# Altium footprint library CM3Board.PcbLib: 127 footprints (part 6 of 8)
Each footprint in its own frame and in the unit in brackets; x right, y up, seen from the top. Pads: shape width x height; smd on the part's side, far side on the other; paste and mask are expansions set on the pad; w line width, h text height; cw(c..) or ccw(c..) is an arc to the next point about the centre after c.
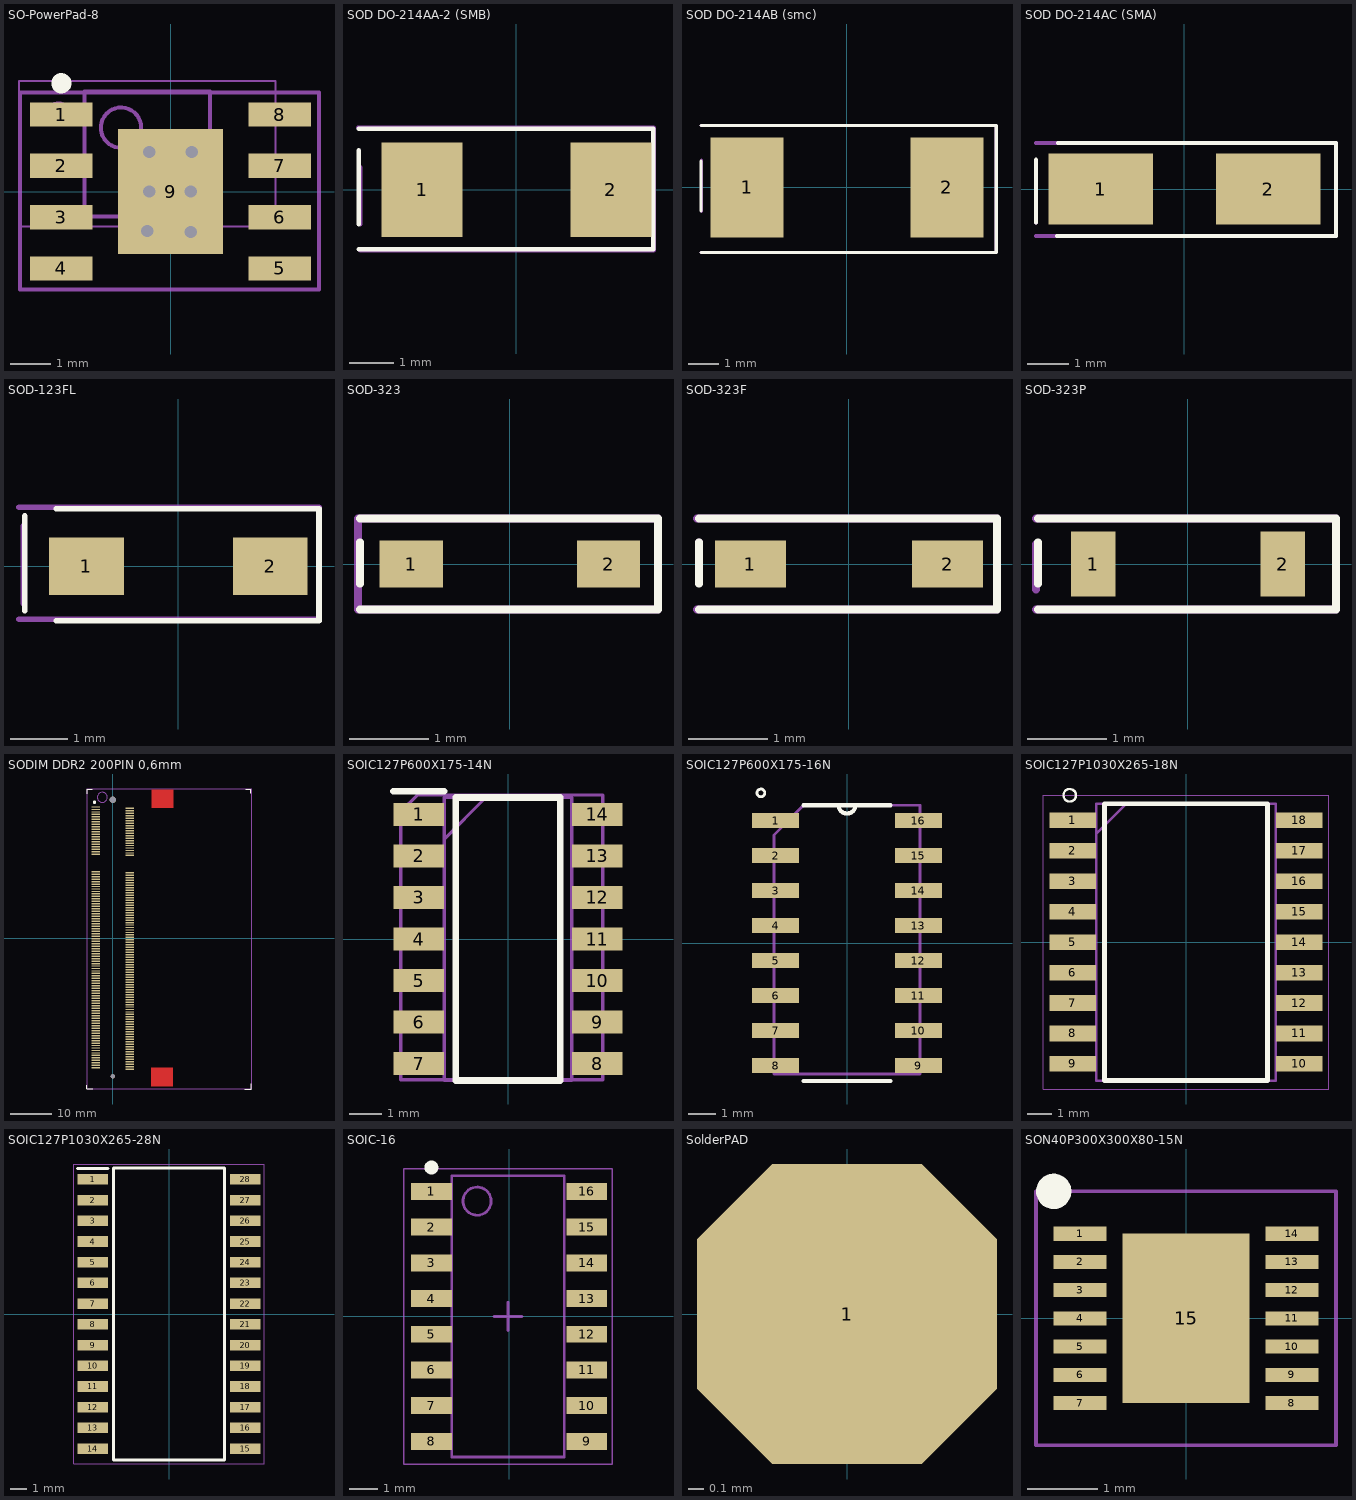
[diagram p5: the footprints below, top view; thin cyan lines are the x and y axes]

## SO-PowerPad-8 [mm]
pads (9):
  rect 1.55x0.6 smd: 1(-2.7,1.905) 2(-2.7,0.635) 3(-2.7,-0.635) 4(-2.7,-1.905) 5(2.7,-1.905) 6(2.7,-0.635) 7(2.7,0.635) 8(2.7,1.905)
  rect 2.6x3.1 smd: 9(0,0)
via -0.525,0 diameter 0.5 hole 0.3
via 0.5,0 diameter 0.5 hole 0.3
via -0.575,-0.975 diameter 0.5 hole 0.3
via 0.525,0.975 diameter 0.5 hole 0.3
via -0.525,0.975 diameter 0.5 hole 0.3
via 0.5,-1 diameter 0.5 hole 0.3
Top Overlay:
  circle w0.25: c-2.7,2.68 r0.125
Mechanical 13:
  circle w0.1: c-1.225,1.58 r0.5
  lines w0.1: -2.125,-0.62 -2.125,2.48 0.975,2.48 0.975,-0.62 -2.125,-0.62
Mechanical 15:
  lines w0.05: -3.75,-0.87 -3.75,2.73 2.6,2.73 2.6,-0.87 -3.75,-0.87
  lines w0.1: -1.075,0.93 -0.075,0.93 ; -0.575,0.43 -0.575,1.43
Mechanical 29:
  circle w0.254: c-2.775,1.925 r0.177
  lines w0.1: -3.725,-2.425 -3.725,2.454 3.675,2.454 3.675,-2.425 -3.725,-2.425
  text ".Designator" at -2.85,-1.225 h1
3D body "TPS54360DDA.step": height 1.78, standoff 0.19, extent -3.075,-2.475 3.125,2.525

## SOD DO-214AA-2 (SMB) [mm]
pads (2):
  rect 1.8x2.1 smd: 1(-2.1,0) 2(2.1,0)
Top Overlay:
  lines w0.1: -3.505,-1.325 3.045,-1.325 3.045,1.35 -3.505,1.35 ; -3.505,-0.775 -3.505,0.875
Mechanical 29:
  lines w0.1: -3.525,1.375 3.05,1.375 3.05,-1.35 -3.475,-1.35 ; -3.475,-0.775 -3.475,0.5
  text ".Designator" at -0.525,-0.25 h1
3D body "DO-214AA SMB.step": height 2.35, standoff 0.05, extent -2.7,-1.8 2.7,1.8

## SOD DO-214AB (smc) [mm]
pads (2):
  rect 2.4x3.3 smd: 1(-3.3,0) 2(3.3,0)
Top Overlay:
  lines w0.1: -4.825,-2.15 4.925,-2.15 4.925,2.05 -4.825,2.05 ; -4.825,-0.775 -4.825,0.875
Mechanical 29:
  lines w0.1: -4.825,-2.15 4.925,-2.15 4.925,2.05 -4.825,2.05 ; -4.8,-0.8 -4.8,0.9
  text ".Designator" at -4.05,-1.275 h1
3D body "DO-214AB.step": height 2.4, standoff 0.03, extent -4.09,-3.05 4.04,3.05

## SOD DO-214AC (SMA) [mm]
pads (2):
  rect 2.5x1.7 smd: 1(-2,0) 2(2,0)
Top Overlay:
  lines w0.1: -3.55,-0.8 -3.55,0.7 ; -3.05,-1.125 3.625,-1.125 3.625,1.1 -3.025,1.1
Mechanical 29:
  lines w0.1: -3.55,-1.125 3.625,-1.125 3.625,1.1 -3.55,1.1 ; -3.55,-0.8 -3.55,0.625
  text ".Designator" at -2.825,-0.875 h1
3D body "DO-214AC.step": height 2.6, standoff 0.03, extent -2.55,-1.425 2.95,1.375

## SOD-123FL [mm]
pads (2):
  rect 1.3x1 smd: 1(-1.6,0) 2(1.6,0)
Top Overlay:
  lines w0.1: -2.675,-0.775 -2.675,0.875 ; -2.125,-0.95 2.45,-0.95 2.45,1 -2.125,1
Mechanical 29:
  lines w0.1: -2.775,-0.925 2.45,-0.925 2.45,1.025 -2.775,1.025 ; -2.7,-0.65 -2.7,0.7
  text ".Designator" at -1.8,-0.35 h1
3D body "SOD-123FL.STEP": height 0.95, standoff 0, extent -1.825,-0.825 1.775,0.825

## SOD-323 [mm]
pads (2):
  rect 0.8x0.6 smd: 1(-1.25,0) 2(1.25,0)
Top Overlay:
  lines w0.1: -1.9,-0.575 1.875,-0.575 1.875,0.575 -1.9,0.575 ; -1.9,-0.25 -1.9,0.275
Mechanical 29:
  lines w0.1: 1.875,0.575 1.875,-0.575 0.75,-0.575 -1.925,-0.575 -1.925,0.575 1.875,0.575 ; 1.875,0.575 1.875,0.575
  text ".Designator" at -1.6,-0.4 h1
3D body "SOD323.step": height 0.9, standoff -0.09, extent -1.225,-0.625 1.275,0.625

## SOD-323F [mm]
pads (2):
  rect 0.9x0.6 smd: 1(-1.25,0) 2(1.25,0)
Top Overlay:
  lines w0.1: -1.9,-0.575 1.875,-0.575 1.875,0.575 -1.9,0.575 ; -1.9,-0.25 -1.9,0.275
Mechanical 29:
  lines w0.1: -1.925,-0.575 0.75,-0.575 1.875,-0.575 1.875,0.575 ; -1.925,0.575 1.875,0.575 ; -1.9,-0.225 -1.9,0.275 ; 1.875,0.575 1.875,0.575
  text ".Designator" at -1.6,-0.4 h1
3D body "SOD323.step": height 0.9, standoff -0.09, extent -1.225,-0.625 1.275,0.625

## SOD-323P [mm]
pads (2):
  rect 0.56x0.82 smd: 1(-1.2,0) 2(1.2,0)
Top Overlay:
  lines w0.1: -1.9,-0.575 1.875,-0.575 1.875,0.575 -1.9,0.575 ; -1.9,-0.25 -1.9,0.275
Mechanical 29:
  lines w0.1: -1.925,-0.575 0.75,-0.575 1.875,-0.575 1.875,0.575 ; -1.925,-0.325 -1.925,0.25 ; -1.925,0.575 1.875,0.575 ; 1.875,0.575 1.875,0.575
  text ".Designator" at -1.6,-0.4 h1
3D body "SOD323.step": height 0.9, standoff -0.09, extent -1.225,-0.625 1.275,0.625

## SODIM DDR2 200PIN 0,6mm [mm]
height 3.56
pads (202):
  rect 2x0.35 smd: 1(-4.1,31.65) 2(4.1,31.35) 3(-4.1,31.05) 4(4.1,30.75) 5(-4.1,30.45) 6(4.1,30.15) 7(-4.1,29.85) 8(4.1,29.55) 9(-4.1,29.25) 10(4.1,28.95) 11(-4.1,28.65) 12(4.1,28.35) 13(-4.1,28.05) 14(4.1,27.75) 15(-4.1,27.45) 16(4.1,27.15) 17(-4.1,26.85) 18(4.1,26.55) 19(-4.1,26.25) 20(4.1,25.95) 21(-4.1,25.65) 22(4.1,25.35) 23(-4.1,25.05) 24(4.1,24.75) 25(-4.1,24.45) 26(4.1,24.15) 27(-4.1,23.85) 28(4.1,23.55) 29(-4.1,23.25) 30(4.1,22.95) 31(-4.1,22.65) 32(4.1,22.35) 33(-4.1,22.05) 34(4.1,21.75) 35(-4.1,21.45) 36(4.1,21.15) 37(-4.1,20.85) 38(4.1,20.55) 39(-4.1,20.25) 40(4.1,19.95) 41(-4.1,16.05) 42(4.1,15.75) 43(-4.1,15.45) 44(4.1,15.15) 45(-4.1,14.85) 46(4.1,14.55) 47(-4.1,14.25) 48(4.1,13.95) 49(-4.1,13.65) 50(4.1,13.35) 51(-4.1,13.05) 52(4.1,12.75) 53(-4.1,12.45) 54(4.1,12.15) 55(-4.1,11.85) 56(4.1,11.55) 57(-4.1,11.25) 58(4.1,10.95) 59(-4.1,10.65) 60(4.1,10.35) 61(-4.1,10.05) 62(4.1,9.75) 63(-4.1,9.45) 64(4.1,9.15) 65(-4.1,8.85) 66(4.1,8.55) 67(-4.1,8.25) 68(4.1,7.95) 69(-4.1,7.65) 70(4.1,7.35) 71(-4.1,7.05) 72(4.1,6.75) 73(-4.1,6.45) 74(4.1,6.15) 75(-4.1,5.85) 76(4.1,5.55) 77(-4.1,5.25) 78(4.1,4.95) 79(-4.1,4.65) 80(4.1,4.35) 81(-4.1,4.05) 82(4.1,3.75) 83(-4.1,3.45) 84(4.1,3.15) 85(-4.1,2.85) 86(4.1,2.55) 87(-4.1,2.25) 88(4.1,1.95) 89(-4.1,1.65) 90(4.1,1.35) 91(-4.1,1.05) 92(4.1,0.75) 93(-4.1,0.45) 94(4.1,0.15) 95(-4.1,-0.15) 96(4.1,-0.45) 97(-4.1,-0.75) 98(4.1,-1.05) 99(-4.1,-1.35) 100(4.1,-1.65) 101(-4.1,-1.95) 102(4.1,-2.25) 103(-4.1,-2.55) 104(4.1,-2.85) 105(-4.1,-3.15) 106(4.1,-3.45) 107(-4.1,-3.75) 108(4.1,-4.05) 109(-4.1,-4.35) 110(4.1,-4.65) 111(-4.1,-4.95) 112(4.1,-5.25) 113(-4.1,-5.55) 114(4.1,-5.85) 115(-4.1,-6.15) 116(4.1,-6.45) 117(-4.1,-6.75) 118(4.1,-7.05) 119(-4.1,-7.35) 120(4.1,-7.65) 121(-4.1,-7.95) 122(4.1,-8.25) 123(-4.1,-8.55) 124(4.1,-8.85) 125(-4.1,-9.15) 126(4.1,-9.45) 127(-4.1,-9.75) 128(4.1,-10.05) 129(-4.1,-10.35) 130(4.1,-10.65) 131(-4.1,-10.95) 132(4.1,-11.25) 133(-4.1,-11.55) 134(4.1,-11.85) 135(-4.1,-12.15) 136(4.1,-12.45) 137(-4.1,-12.75) 138(4.1,-13.05) 139(-4.1,-13.35) 140(4.1,-13.65) 141(-4.1,-13.95) 142(4.1,-14.25) 143(-4.1,-14.55) 144(4.1,-14.85) 145(-4.1,-15.15) 146(4.1,-15.45) 147(-4.1,-15.75) 148(4.1,-16.05) 149(-4.1,-16.35) 150(4.1,-16.65) 151(-4.1,-16.95) 152(4.1,-17.25) 153(-4.1,-17.55) 154(4.1,-17.85) 155(-4.1,-18.15) 156(4.1,-18.45) 157(-4.1,-18.75) 158(4.1,-19.05) 159(-4.1,-19.35) 160(4.1,-19.65) 161(-4.1,-19.95) 162(4.1,-20.25) 163(-4.1,-20.55) 164(4.1,-20.85) 165(-4.1,-21.15) 166(4.1,-21.45) 167(-4.1,-21.75) 168(4.1,-22.05) 169(-4.1,-22.35) 170(4.1,-22.65) 171(-4.1,-22.95) 172(4.1,-23.25) 173(-4.1,-23.55) 174(4.1,-23.85) 175(-4.1,-24.15) 176(4.1,-24.45) 177(-4.1,-24.75) 178(4.1,-25.05) 179(-4.1,-25.35) 180(4.1,-25.65) 181(-4.1,-25.95) 182(4.1,-26.25) 183(-4.1,-26.55) 184(4.1,-26.85) 185(-4.1,-27.15) 186(4.1,-27.45) 187(-4.1,-27.75) 188(4.1,-28.05) 189(-4.1,-28.35) 190(4.1,-28.65) 191(-4.1,-28.95) 192(4.1,-29.25) 193(-4.1,-29.55) 194(4.1,-29.85) 195(-4.1,-30.15) 196(4.1,-30.45) 197(-4.1,-30.75) 198(4.1,-31.05) 199(-4.1,-31.35) 200(4.1,-31.65)
  round 1 hole 1.1: ""(0,-33.4)
  round 1.5 hole 1.6: ""(0,33.4)
Top Layer:
  rectangle: 9.2,-35.8 14.6,-31.3
  rectangle: 9.3,31.4 14.7,35.9
Top Overlay:
  circle w0.4: c-4.4,32.8 r0.2
  lines w0.2: -6.24,-35.52 -6.24,-36.42 -4.88,-36.42 ; -6.2,34.82 -6.2,35.99 -4.94,35.99 ; 31.85,-36.45 33.38,-36.45 33.39,-35.17 ; 32.09,35.98 33.34,35.98 33.34,34.96
Mechanical 29:
  circle w0.254: c-2.5,34 r1.208
  lines w0.254: -6.2,-36.4 33.38,-36.4 33.38,36 -6.2,36 -6.2,-36.4
  text ".Designator" at -0.9,17.3 h1.52
3D body "200pinSODIMdd2.stp": height 5.76, standoff -0.66, extent -5,-35.75 21.54,35.75

## SOIC127P600X175-14N [mm]
pads (14):
  rect 1.55x0.7 smd: 1(-2.725,3.81) 2(-2.725,2.54) 3(-2.725,1.27) 4(-2.725,0) 5(-2.725,-1.27) 6(-2.725,-2.54) 7(-2.725,-3.81) 8(2.725,-3.81) 9(2.725,-2.54) 10(2.725,-1.27) 11(2.725,0) 12(2.725,1.27) 13(2.725,2.54) 14(2.725,3.81)
Top Overlay:
  lines w0.2: -3.5,4.51 -1.95,4.51 ; -1.6,-4.325 1.6,-4.325 1.6,4.325 -1.6,4.325 -1.6,-4.325
Mechanical 13:
  lines w0.1: -1.95,3.055 -0.68,4.325 ; -1.95,-4.325 1.95,-4.325 1.95,4.325 -1.95,4.325 -1.95,-4.325
Mechanical 29:
  lines w0.1: -3.275,-4.3 2.9,-4.3 2.9,4.4 -2.775,4.4 -3.275,3.9 -3.275,-4.3
  text ".Designator" at -0.725,-0.075 h1
3D body "HEF4093BT,652.stp": height 1.75, standoff 0, extent -3,-4.325 3,4.325

## SOIC127P600X175-16N [mil]
pads (16):
  rect 67x21 smd: 1(-102,175) 2(-102,125) 3(-102,75) 4(-102,25) 5(-102,-25) 6(-102,-75) 7(-102,-125) 8(-102,-175) 9(102,-175) 10(102,-125) 11(102,-75) 12(102,-25) 13(102,25) 14(102,75) 15(102,125) 16(102,175)
Top Overlay:
  circle w3.94: c-123.03,214.57 r5.57
  lines w6: -62,-197 62,-197 ; -62,197 -12,197 ; 62,197 12,197 ; -12,197 ccw(c0,197) 12,197 ; -12,197 12,197
Mechanical 29:
  lines w3.94: -104.33,-187.01 104.33,-187.01 104.33,196.85 -62.01,196.85 -104.33,154.53 -104.33,142.72 -104.33,-187.01
  text ".Designator" at 23.62,-98.43 h39.37
3D body "User Library-so16.step": height 66.93, standoff 0, extent -116.14,-200.79 120.08,200.78

## SOIC127P1030X265-18N [mm]
pads (18):
  rect 1.95x0.65 smd: 1(-4.725,5.08) 2(-4.725,3.81) 3(-4.725,2.54) 4(-4.725,1.27) 5(-4.725,0) 6(-4.725,-1.27) 7(-4.725,-2.54) 8(-4.725,-3.81) 9(-4.725,-5.08) 10(4.725,-5.08) 11(4.725,-3.81) 12(4.725,-2.54) 13(4.725,-1.27) 14(4.725,0) 15(4.725,1.27) 16(4.725,2.54) 17(4.725,3.81) 18(4.725,5.08)
Top Overlay:
  circle w0.1: c-4.85,6.125 r0.261
  lines w0.2: -3.4,-5.775 3.4,-5.775 3.4,5.775 -3.4,5.775 -3.4,-5.775
Mechanical 13:
  lines w0.1: -3.75,4.505 -2.48,5.775 ; -3.75,-5.775 3.75,-5.775 3.75,5.775 -3.75,5.775 -3.75,-5.775
Mechanical 29:
  lines w0.05: -5.95,-6.125 5.95,-6.125 5.95,6.125 -5.95,6.125 -5.95,-6.125
  text ".Designator" at -2.15,0.15 h1
3D body "ULN2803ADWR.stp": height 2.65, standoff 0, extent -5.15,-5.775 5.15,5.775

## SOIC127P1030X265-28N [mm]
pads (28):
  rect 1.85x0.65 smd: 1(-4.675,8.255) 2(-4.675,6.985) 3(-4.675,5.715) 4(-4.675,4.445) 5(-4.675,3.175) 6(-4.675,1.905) 7(-4.675,0.635) 8(-4.675,-0.635) 9(-4.675,-1.905) 10(-4.675,-3.175) 11(-4.675,-4.445) 12(-4.675,-5.715) 13(-4.675,-6.985) 14(-4.675,-8.255) 15(4.675,-8.255) 16(4.675,-6.985) 17(4.675,-5.715) 18(4.675,-4.445) 19(4.675,-3.175) 20(4.675,-1.905) 21(4.675,-0.635) 22(4.675,0.635) 23(4.675,1.905) 24(4.675,3.175) 25(4.675,4.445) 26(4.675,5.715) 27(4.675,6.985) 28(4.675,8.255)
Top Overlay:
  lines w0.2: -5.6,8.93 -3.75,8.93 ; -3.4,-8.95 -3.4,8.95 3.4,8.95 3.4,-8.95 -3.4,-8.95
Mechanical 29:
  lines w0.05: -5.85,-9.2 5.85,-9.2 5.85,9.2 -5.85,9.2 -5.85,-9.2
  text ".Designator" at -1.44,8.16 h1.52
3D body "MCP23017T-E_SO.stp": height 2.65, standoff 0, extent -5.15,-8.95 5.15,8.95

## SOIC-16 [mm] "SOIC, 16-Leads, Body 9,90x3,90mm, Pitch 1,27mm, IPC Medium Density"
height 1.26
pads (16):
  rect 1.45x0.6 smd: 1(-2.762,4.445) 2(-2.762,3.175) 3(-2.762,1.905) 4(-2.762,0.635) 5(-2.762,-0.635) 6(-2.762,-1.905) 7(-2.762,-3.175) 8(-2.762,-4.445) 9(2.763,-4.445) 10(2.763,-3.175) 11(2.763,-1.905) 12(2.763,-0.635) 13(2.763,0.635) 14(2.763,1.905) 15(2.763,3.175) 16(2.763,4.445)
Top Overlay:
  circle w0.25: c-2.762,5.295 r0.125
Mechanical 15:
  lines w0.05: -3.737,-5.25 -3.737,5.25 3.663,5.25 3.663,-5.25 -3.737,-5.25
  lines w0.1: -0.537,0 0.463,0 ; -0.037,-0.5 -0.037,0.5
Mechanical 29:
  circle w0.1: c-1.137,4.1 r0.5
  lines w0.1: -2.037,-5 -2.037,5 1.963,5 1.963,-5 -2.037,-5
  text ".Designator" at -0.418,3.683 h1.52
3D body "SOIC-16-3.step": height 1.7, standoff 0, extent -3.136,-4.953 3.061,4.953

## SolderPAD [mm]
pads (1):
  oct 2x2 smd paste-2: 1(0,0)

## SON40P300X300X80-15N [mm]
pads (15):
  rect 0.75x0.2 smd: 1(-1.5,1.2) 2(-1.5,0.8) 3(-1.5,0.4) 4(-1.5,0) 5(-1.5,-0.4) 6(-1.5,-0.8) 7(-1.5,-1.2) 8(1.5,-1.2) 9(1.5,-0.8) 10(1.5,-0.4) 11(1.5,0) 12(1.5,0.4) 13(1.5,0.8) 14(1.5,1.2)
  rect 1.8x2.4 smd: 15(0,0)
Top Overlay:
  circle w0.25: c-1.875,1.8 r0.125
Mechanical 29:
  lines w0.05: -2.125,-1.8 -2.125,1.8 2.125,1.8 2.125,-1.8 -2.125,-1.8
  text ".Designator" at -2.27,-0.85 h1
3D body "MAX98306ETD+T.stp": height 0.8, standoff 0, extent -1.55,-1.5 1.55,1.5